# Altium footprint library lib_datalogger.PcbLib: 866 footprints (part 39 of 55)
Each footprint in its own frame and in the unit in brackets; x right, y up, seen from the top. Pads: shape width x height; smd on the part's side, far side on the other; paste and mask are expansions set on the pad; w line width, h text height; cw(c..) or ccw(c..) is an arc to the next point about the centre after c.
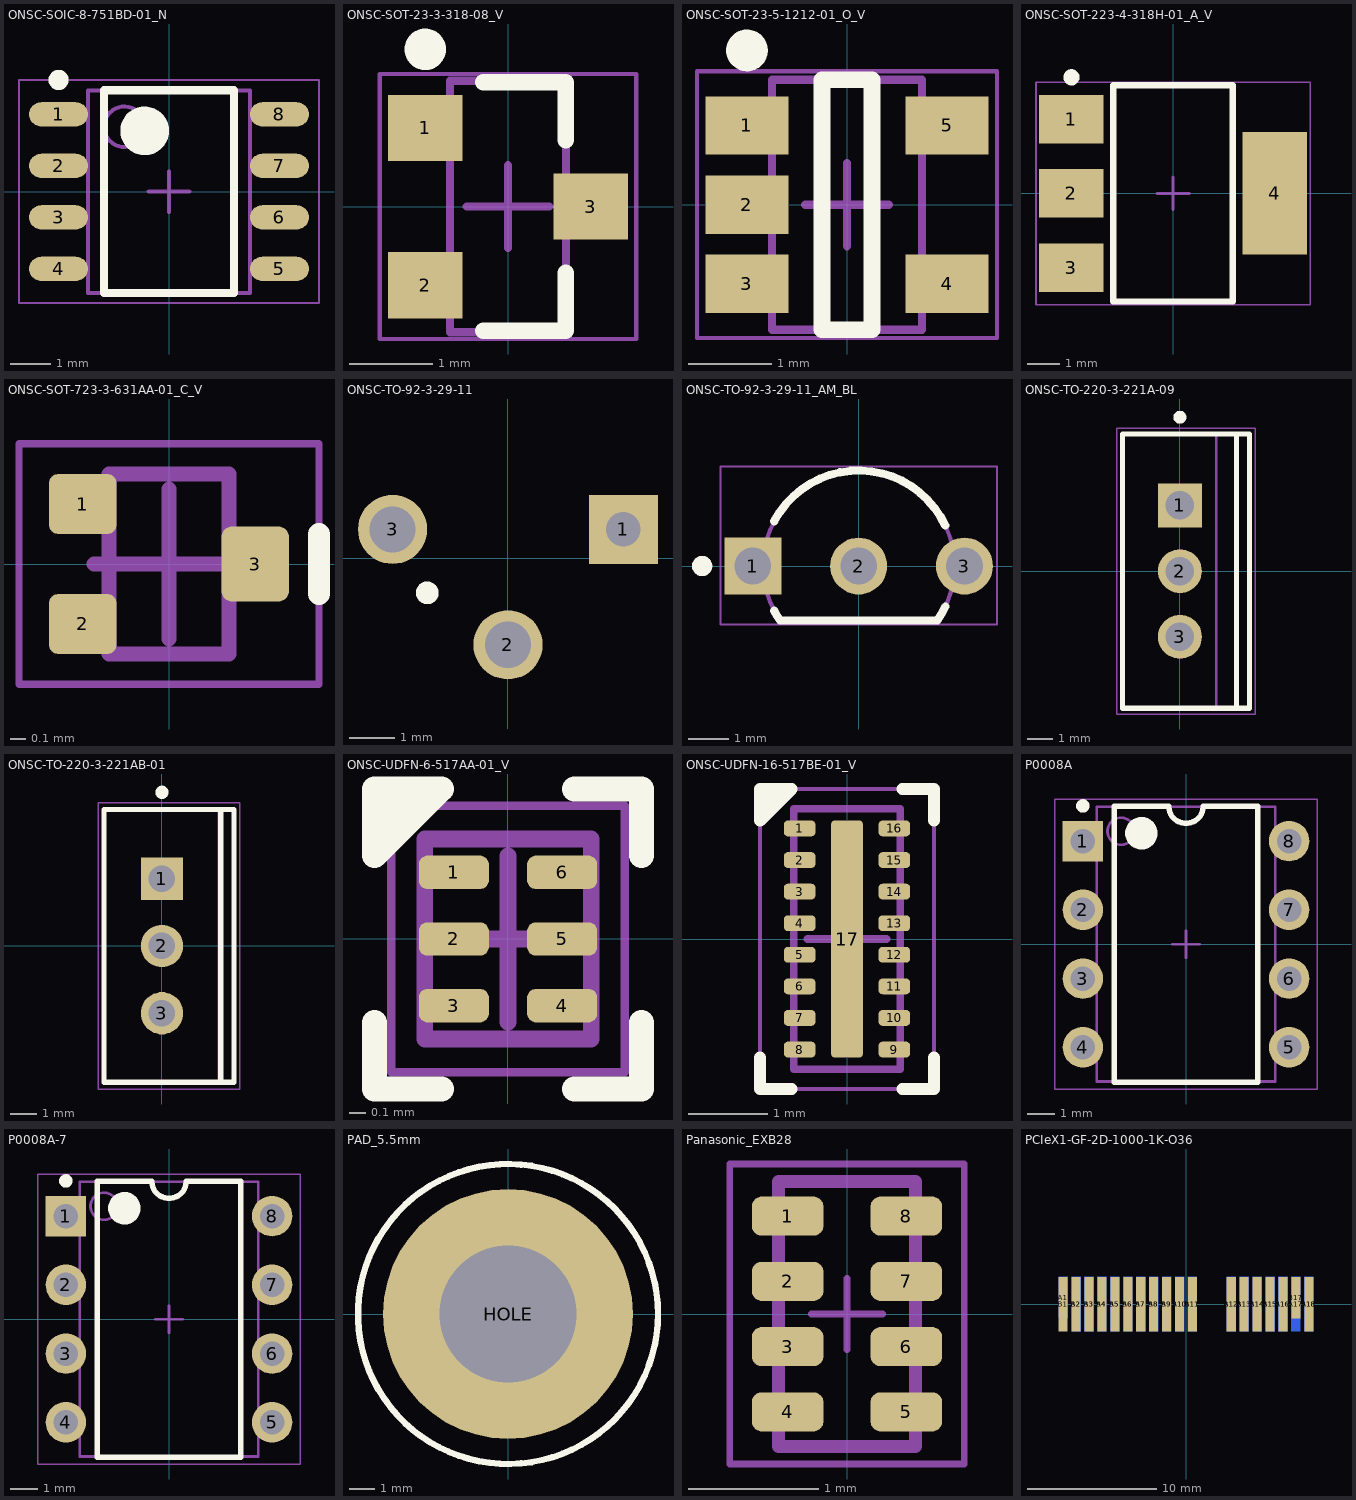
[diagram p38: the footprints below, top view; thin cyan lines are the x and y axes]

## ONSC-SOIC-8-751BD-01_N [mm] "SOIC, 8-Leads, Body 5x4mm, Pitch 1.27mm, IPC Medium Density"
height 1.75
pads (8):
  oval 1.45x0.6 smd: 1(-2.725,1.905) 2(-2.725,0.635) 3(-2.725,-0.635) 4(-2.725,-1.905) 5(2.725,-1.905) 6(2.725,-0.635) 7(2.725,0.635) 8(2.725,1.905)
Top Overlay:
  circle w0.25: c-2.725,2.755 r0.125
  circle w0.6: c-0.6,1.5 r0.3
  lines w0.2: -1.6,-2.5 -1.6,2.5 1.6,2.5 1.6,-2.5 -1.6,-2.5
Mechanical 13:
  circle w0.1: c-1.1,1.6 r0.5
  lines w0.1: -2,-2.5 -2,2.5 2,2.5 2,-2.5 -2,-2.5
Mechanical 15:
  lines w0.05: -3.7,-2.75 -3.7,2.75 3.7,2.75 3.7,-2.75 -3.7,-2.75
  lines w0.1: -0.5,0 0.5,0 ; 0,-0.5 0,0.5
3D body "SOIC127P600X175-8N.step": height 1.75, standoff 0, extent -3,-2.5 3,2.5

## ONSC-SOT-23-3-318-08_V [mm] "SOT23, 3-Leads, Body 3.04x1.4mm, Pitch 0.95mm"
height 1.11
pads (3):
  rect 0.9x0.8 smd: 1(-1,0.95) 2(-1,-0.95) 3(1,0)
Top Overlay:
  circle w0.25: c-1,1.9 r0.125
  lines w0.2: -0.3,-1.5 0.7,-1.5 0.7,-0.8 ; -0.3,1.5 0.7,1.5 0.7,0.8
Mechanical 13:
  lines w0.1: -0.7,-1.52 -0.7,1.52 0.7,1.52 0.7,-1.52 -0.7,-1.52
Mechanical 15:
  lines w0.05: -1.55,-1.6 -1.55,1.6 1.55,1.6 1.55,-1.6 -1.55,-1.6
  lines w0.1: -0.5,0 0.5,0 ; 0,-0.5 0,0.5
3D body "SOT95P237X111-3L.step": height 1.11, standoff 0, extent -1.42,-1.52 1.42,1.52

## ONSC-SOT-23-5-1212-01_O_V [mm] "SOT23, 5-Leads, Body 3x1.80mm, Pitch 0.95mm"
height 1.36
pads (5):
  rect 1x0.7 smd: 1(-1.2,0.95) 2(-1.2,0) 3(-1.2,-0.95) 4(1.2,-0.95) 5(1.2,0.95)
Top Overlay:
  circle w0.25: c-1.2,1.85 r0.125
  lines w0.2: -0.3,-1.5 0.3,-1.5 0.3,1.5 -0.3,1.5 -0.3,-1.5
Mechanical 13:
  lines w0.1: -0.9,-1.5 -0.9,1.5 0.9,1.5 0.9,-1.5 -0.9,-1.5
Mechanical 15:
  lines w0.05: -1.8,-1.6 -1.8,1.6 1.8,1.6 1.8,-1.6 -1.8,-1.6
  lines w0.1: -0.5,0 0.5,0 ; 0,-0.5 0,0.5
3D body "SOT95P280X136-5L.step": height 1.36, standoff 0, extent -1.55,-1.5 1.55,1.5

## ONSC-SOT-223-4-318H-01_A_V [mm] "SOT223, 4-Leads, Body 6.7x3.7mm, Pitch 2.3mm"
height 1.8
pads (4):
  rect 2x1.5 smd: 1(-3.15,2.3) 2(-3.15,0) 3(-3.15,-2.3)
  rect 2x3.8 smd: 4(3.15,0)
Top Overlay:
  circle w0.25: c-3.15,3.6 r0.125
  lines w0.2: -1.85,-3.35 -1.85,3.35 1.85,3.35 1.85,-3.35 -1.85,-3.35
Mechanical 13:
  lines w0.1: -1.85,-3.35 -1.85,3.35 1.85,3.35 1.85,-3.35 -1.85,-3.35
Mechanical 15:
  lines w0.05: -4.25,-3.45 -4.25,3.45 4.25,3.45 4.25,-3.45 -4.25,-3.45
  lines w0.1: -0.5,0 0.5,0 ; 0,-0.5 0,0.5
3D body "SOT230P700X180-4L.step": height 1.8, standoff 0, extent -3.65,-3.35 3.65,3.35

## ONSC-SOT-723-3-631AA-01_C_V [mm] "SOT23, 3-Leads, Body 1.25x0.85mm, Pitch 0.4mm"
height 0.55
pads (3):
  rrect30% 0.45x0.4 smd: 1(-0.575,0.4) 2(-0.575,-0.4)
  rrect30% 0.45x0.5 smd: 3(0.575,0)
Top Overlay:
  lines w0.15: 1,-0.2 1,0.2
Mechanical 13:
  lines w0.1: -0.4,-0.6 0.4,-0.6 0.4,0.6 -0.4,0.6 -0.4,-0.6
Mechanical 15:
  lines w0.05: -1,-0.8 1,-0.8 1,0.8 -1,0.8 -1,-0.8
  lines w0.1: -0.5,0 0.5,0 ; 0,-0.5 0,0.5
Top Designator:
  text ".Designator" at -1.27,-0.127 h0.6
3D body "SOT-723.STEP": height 0.45, standoff -0.01, extent -0.525,-0.625 0.525,0.625

## ONSC-TO-92-3-29-11 [mil] "TO, 3-Leads, Body Dia 4.7mm, Pitch 1.27mm"
height 309.84
pads (3):
  rect 60x60 hole 30: 1(100,25)
  round 60 hole 40: 2(0,-75) 3(-100,25)
Top Overlay:
  circle w9.84: c-70,-30 r4.92
Bottom Overlay:
  lines w10: -94,-6 -85,-50 -25,-50 ; -77.82,54.49 cw(c0,0) 77.82,54.49 ; 25,-50 85,-50 94,-6

## ONSC-TO-92-3-29-11_AM_BL [mm] "TO, 3-Leads, Body Dia 4.7mm, Pitch 2.6mm"
height 8.923
pads (3):
  rect 1.4x1.4 hole 0.9: 1(-2.6,0)
  round 1.4 hole 0.9: 2(0,0) 3(2.6,0)
Top Overlay:
  circle w0.25: c-3.85,0 r0.125
  lines w0.2: -2.077,-1.1 ccw(c0,0) -1.934,-1.335 1.934,-1.335 ccw(c0,0) 2.129,-0.994 ; -2.077,1.1 cw(c0,0) 2.129,0.994
Mechanical 13:
  lines w0.1: -1.934,-1.335 cw(c0,0) 1.934,-1.335 -1.934,-1.335
Mechanical 15:
  lines w0.05: -3.4,-1.435 -3.4,2.45 3.4,2.45 3.4,-1.435 -3.4,-1.435
  lines w0.1: -0.5,0 0.5,0 ; 0,-0.5 0,0.5
3D body "PCB3.step": height 4, standoff -8.7, extent -2.836,-0.222 2.836,0.223
3D body: height 5.33, standoff 1.5, extent -2.359,-1.335 2.359,2.351

## ONSC-TO-220-3-221A-09 [mm] "FM, 3-Leads, Body 10.55x4.85mm, Pitch 2.54mm"
height 19.85
pads (3):
  rect 1.7x1.7 hole 1.1: 1(0,2.54)
  round 1.7 hole 1.1: 2(0,0) 3(0,-2.54)
Top Overlay:
  circle w0.25: c0,5.95 r0.125
  lines w0.2: 2.185,-5.3 2.185,5.3 ; -2.215,-5.3 -2.215,5.3 2.685,5.3 2.685,-5.3 -2.215,-5.3
Mechanical 13:
  lines w0.1: 1.41,-5.275 1.41,5.275 ; -2.19,-5.275 2.66,-5.275 2.66,5.275 -2.19,5.275 -2.19,-5.275
Mechanical 15:
  lines w0.05: -2.44,-5.525 2.91,-5.525 2.91,5.525 -2.44,5.525 -2.44,-5.525
  lines w0.1: -0.5,0 0.5,0 ; 0,-0.5 0,0.5
3D body: height 19.85, standoff 18.98, extent 1.41,-5.05 2.66,5.05
3D body: height 17.43, standoff 17.05, extent 1.41,-5.05 2.66,-1.925
3D body: height 17.43, standoff 17.05, extent 1.41,1.925 2.66,5.05
3D body: height 17.05, standoff 16.67, extent 1.41,-5.05 2.66,-1.925
3D body: height 17.05, standoff 16.67, extent 1.41,1.925 2.66,5.05
3D body: height 17.79, standoff 17.43, extent 1.41,-5.05 2.66,-1.888
3D body: height 17.79, standoff 17.43, extent 1.41,1.888 2.66,5.05
3D body: height 16.68, standoff 16.31, extent 1.41,-5.05 2.66,-1.888
3D body: height 16.68, standoff 16.31, extent 1.41,1.888 2.66,5.05
3D body: height 18.12, standoff 17.79, extent 1.41,-5.05 2.66,-1.778
3D body: height 18.12, standoff 17.79, extent 1.41,1.778 2.66,5.05
3D body: height 16.32, standoff 15.98, extent 1.41,-5.05 2.66,-1.778
3D body: height 16.32, standoff 15.98, extent 1.41,1.778 2.66,5.05
3D body: height 18.42, standoff 18.12, extent 1.41,-5.05 2.66,-1.601
3D body: height 18.42, standoff 18.12, extent 1.41,1.601 2.66,5.05
3D body: height 15.99, standoff 15.69, extent 1.41,-5.05 2.66,-1.601
3D body: height 15.99, standoff 15.69, extent 1.41,1.601 2.66,5.05
3D body: height 18.66, standoff 18.41, extent 1.41,-5.05 2.66,-1.361
3D body: height 18.66, standoff 18.41, extent 1.41,1.361 2.66,5.05
3D body: height 15.69, standoff 15.45, extent 1.41,-5.05 2.66,-1.361
3D body: height 15.69, standoff 15.45, extent 1.41,1.361 2.66,5.05
3D body: height 18.83, standoff 18.65, extent 1.41,-5.05 2.66,-1.069
3D body: height 18.83, standoff 18.65, extent 1.41,1.069 2.66,5.05
3D body: height 15.45, standoff 15.27, extent 1.41,-5.05 2.66,-1.069
3D body: height 15.45, standoff 15.27, extent 1.41,1.069 2.66,5.05
3D body: height 18.94, standoff 18.83, extent 1.41,-5.05 2.66,-0.737
3D body: height 18.94, standoff 18.83, extent 1.41,0.737 2.66,5.05
3D body: height 15.28, standoff 15.16, extent 1.41,-5.05 2.66,-0.737
3D body: height 15.28, standoff 15.16, extent 1.41,0.737 2.66,5.05
3D body: height 18.98, standoff 18.94, extent 1.41,-5.05 2.66,-0.376
3D body: height 18.98, standoff 18.94, extent 1.41,0.376 2.66,5.05
3D body: height 15.17, standoff 15.13, extent 1.41,-5.05 2.66,-0.376
3D body: height 15.17, standoff 15.13, extent 1.41,0.376 2.66,5.05
3D body: height 15.13, standoff 13.65, extent 1.41,-5.05 2.66,5.05
3D body: height 13.65, standoff 2.8, extent -2.19,-5.275 2.66,5.275
3D body: height 0, standoff -1.6, extent -0.245,-2.94 0.245,-2.14
3D body: height 2.8, standoff 0, extent -0.245,-3.21 0.245,-1.87
3D body: height 0, standoff -1.6, extent -0.245,-0.4 0.245,0.4
3D body: height 2.8, standoff 0, extent -0.245,-0.67 0.245,0.67
3D body: height 0, standoff -1.6, extent -0.245,2.14 0.245,2.94
3D body: height 2.8, standoff 0, extent -0.245,1.87 0.245,3.21

## ONSC-TO-220-3-221AB-01 [mm] "FM, 3-Leads, Body 10.3x4.85mm, Pitch 2.54mm"
height 19.68
pads (3):
  rect 1.6x1.6 hole 1: 1(0,2.54)
  round 1.6 hole 1: 2(0,0) 3(0,-2.54)
Top Overlay:
  circle w0.25: c0,5.8 r0.125
  lines w0.2: 2.215,-5.15 2.215,5.15 ; -2.185,-5.15 -2.185,5.15 2.715,5.15 2.715,-5.15 -2.185,-5.15
Mechanical 13:
  lines w0.1: 2.14,-5.15 2.14,5.15 ; -2.16,-5.15 2.69,-5.15 2.69,5.15 -2.16,5.15 -2.16,-5.15
Mechanical 15:
  lines w0.05: -2.41,-5.4 2.94,-5.4 2.94,5.4 -2.41,5.4 -2.41,-5.4
  lines w0.1: -0.5,0 0.5,0 ; 0,-0.5 0,0.5
3D body: height 19.68, standoff 18.71, extent 2.14,-4.975 2.69,4.975
3D body: height 17.24, standoff 16.88, extent 2.14,-4.975 2.69,-1.825
3D body: height 17.24, standoff 16.88, extent 2.14,1.825 2.69,4.975
3D body: height 16.88, standoff 16.52, extent 2.14,-4.975 2.69,-1.825
3D body: height 16.88, standoff 16.52, extent 2.14,1.825 2.69,4.975
3D body: height 17.58, standoff 17.24, extent 2.14,-4.975 2.69,-1.79
3D body: height 17.58, standoff 17.24, extent 2.14,1.79 2.69,4.975
3D body: height 16.53, standoff 16.18, extent 2.14,-4.975 2.69,-1.79
3D body: height 16.53, standoff 16.18, extent 2.14,1.79 2.69,4.975
3D body: height 17.9, standoff 17.58, extent 2.14,-4.975 2.69,-1.686
3D body: height 17.9, standoff 17.58, extent 2.14,1.686 2.69,4.975
3D body: height 16.19, standoff 15.87, extent 2.14,-4.975 2.69,-1.686
3D body: height 16.19, standoff 15.87, extent 2.14,1.686 2.69,4.975
3D body: height 18.18, standoff 17.89, extent 2.14,-4.975 2.69,-1.517
3D body: height 18.18, standoff 17.89, extent 2.14,1.517 2.69,4.975
3D body: height 15.87, standoff 15.59, extent 2.14,-4.975 2.69,-1.517
3D body: height 15.87, standoff 15.59, extent 2.14,1.517 2.69,4.975
3D body: height 18.4, standoff 18.17, extent 2.14,-4.975 2.69,-1.29
3D body: height 18.4, standoff 18.17, extent 2.14,1.29 2.69,4.975
3D body: height 15.59, standoff 15.36, extent 2.14,-4.975 2.69,-1.29
3D body: height 15.59, standoff 15.36, extent 2.14,1.29 2.69,4.975
3D body: height 18.57, standoff 18.4, extent 2.14,-4.975 2.69,-1.014
3D body: height 18.57, standoff 18.4, extent 2.14,1.014 2.69,4.975
3D body: height 15.37, standoff 15.19, extent 2.14,-4.975 2.69,-1.014
3D body: height 15.37, standoff 15.19, extent 2.14,1.014 2.69,4.975
3D body: height 18.67, standoff 18.57, extent 2.14,-4.975 2.69,-0.698
3D body: height 18.67, standoff 18.57, extent 2.14,0.698 2.69,4.975
3D body: height 15.2, standoff 15.09, extent 2.14,-4.975 2.69,-0.698
3D body: height 15.2, standoff 15.09, extent 2.14,0.698 2.69,4.975
3D body: height 18.71, standoff 18.67, extent 2.14,-4.975 2.69,-0.356
3D body: height 18.71, standoff 18.67, extent 2.14,0.356 2.69,4.975
3D body: height 15.1, standoff 15.06, extent 2.14,-4.975 2.69,-0.356
3D body: height 15.1, standoff 15.06, extent 2.14,0.356 2.69,4.975
3D body: height 15.06, standoff 13.48, extent 2.14,-4.975 2.69,4.975
3D body: height 13.48, standoff 2.8, extent -2.16,-5.15 2.69,5.15
3D body: height 0, standoff -1.6, extent -0.275,-2.92 0.275,-2.16
3D body: height 2.8, standoff 0, extent -0.275,-3.21 0.275,-1.87
3D body: height 0, standoff -1.6, extent -0.275,-0.38 0.275,0.38
3D body: height 2.8, standoff 0, extent -0.275,-0.67 0.275,0.67
3D body: height 0, standoff -1.6, extent -0.275,2.16 0.275,2.92
3D body: height 2.8, standoff 0, extent -0.275,1.87 0.275,3.21

## ONSC-UDFN-6-517AA-01_V [mm] "SON, 6-Leads, Body 1.2x1mm, Pitch 0.4mm"
height 0.55
pads (6):
  rrect50% 0.42x0.2 smd: 1(-0.325,0.4) 2(-0.325,0) 3(-0.325,-0.4) 4(0.325,-0.4) 5(0.325,0) 6(0.325,0.4)
Top Overlay:
  region: -0.8,0.9 -0.8,0.5 -0.4,0.9
  lines w0.15: -0.8,-0.5 -0.8,-0.9 -0.4,-0.9 ; 0.4,-0.9 0.8,-0.9 0.8,-0.5 ; 0.4,0.9 0.8,0.9 0.8,0.5 ; -0.8,0.5 -0.4,0.9 -0.8,0.9 -0.8,0.5
Mechanical 13:
  lines w0.1: -0.5,-0.6 0.5,-0.6 0.5,0.6 -0.5,0.6 -0.5,-0.6
Mechanical 15:
  lines w0.05: -0.7,-0.8 0.7,-0.8 0.7,0.8 -0.7,0.8 -0.7,-0.8
  lines w0.1: -0.5,0 0.5,0 ; 0,-0.5 0,0.5
Top Designator:
  text ".Designator" at -0.762,-1.143 h0.6
3D body: height 0.55, standoff 0, extent -0.5,-0.6 0.5,0.6

## ONSC-UDFN-16-517BE-01_V [mm] "SON, 16-Leads, Body 3.3x1.35mm, Pitch 0.4mm, Thermal Pad 3x0.5mm"
height 0.55
pads (17):
  rrect50% 0.4x0.2 smd: 1(-0.6,1.4) 2(-0.6,1) 3(-0.6,0.6) 4(-0.6,0.2) 5(-0.6,-0.2) 6(-0.6,-0.6) 7(-0.6,-1) 8(-0.6,-1.4) 9(0.6,-1.4) 10(0.6,-1) 11(0.6,-0.6) 12(0.6,-0.2) 13(0.6,0.2) 14(0.6,0.6) 15(0.6,1) 16(0.6,1.4)
  rrect20% 0.4x3 smd: 17(0,0)
Top Overlay:
  region: -1.1,1.9 -1.1,1.5 -0.7,1.9
  lines w0.15: -1.1,-1.5 -1.1,-1.9 -0.7,-1.9 ; 0.7,-1.9 1.1,-1.9 1.1,-1.5 ; 0.7,1.9 1.1,1.9 1.1,1.5 ; -1.1,1.5 -1.1,1.9 -0.7,1.9 -1.1,1.5
Mechanical 13:
  lines w0.1: -0.675,-1.65 0.675,-1.65 0.675,1.65 -0.675,1.65 -0.675,-1.65
Mechanical 15:
  lines w0.05: -1.1,-1.9 1.1,-1.9 1.1,1.9 -1.1,1.9 -1.1,-1.9
  lines w0.1: -0.5,0 0.5,0 ; 0,-0.5 0,0.5
Top Designator:
  text ".Designator" at -1.016,-1.27 h0.6
3D body: height 0.55, standoff 0, extent -0.675,-1.65 0.675,1.65

## P0008A [mm] "DIP, 8-Leads, Body 10.15x6.6mm, Pitch 2.54mm"
height 5.08
pads (8):
  rect 1.5x1.5 hole 0.9: 1(-3.81,3.81)
  round 1.5 hole 0.9: 2(-3.81,1.27) 3(-3.81,-1.27) 4(-3.81,-3.81) 5(3.81,-3.81) 6(3.81,-1.27) 7(3.81,1.27) 8(3.81,3.81)
Top Overlay:
  circle w0.6: c-1.65,4.1 r0.3
  circle w0.25: c-3.81,5.11 r0.125
  lines w0.2: -2.65,-5.1 2.65,-5.1 2.65,5.1 0.635,5.1 cw(c0,5.1) -0.635,5.1 -2.65,5.1 -2.65,-5.1
Mechanical 1:
  text ".Designator" at -1.524,-0.508 h1.02
Mechanical 13:
  circle w0.1: c-2.4,4.175 r0.5
  lines w0.1: -3.3,-5.075 3.3,-5.075 3.3,5.075 -3.3,5.075 -3.3,-5.075
Mechanical 15:
  lines w0.05: -4.85,-5.35 4.85,-5.35 4.85,5.35 -4.85,5.35 -4.85,-5.35
  lines w0.1: -0.5,0 0.5,0 ; 0,-0.5 0,0.5
3D body: height 5.08, standoff 0.51, extent -3.3,-5.075 3.3,5.075
3D body: height 0, standoff -1.6, extent 3.675,3.45 3.945,4.17
3D body: height 2.93, standoff 2.66, extent 3.3,3.31 3.945,4.31
3D body: height 2.66, standoff 0, extent 3.675,3.31 3.945,4.31
3D body: height 0, standoff -1.6, extent 3.675,0.91 3.945,1.63
3D body: height 2.93, standoff 2.66, extent 3.3,0.77 3.945,1.77
3D body: height 2.66, standoff 0, extent 3.675,0.77 3.945,1.77
3D body: height 0, standoff -1.6, extent 3.675,-1.63 3.945,-0.91
3D body: height 2.93, standoff 2.66, extent 3.3,-1.77 3.945,-0.77
3D body: height 2.66, standoff 0, extent 3.675,-1.77 3.945,-0.77
3D body: height 0, standoff -1.6, extent 3.675,-4.17 3.945,-3.45
3D body: height 2.93, standoff 2.66, extent 3.3,-4.31 3.945,-3.31
3D body: height 2.66, standoff 0, extent 3.675,-4.31 3.945,-3.31
3D body: height 0, standoff -1.6, extent -3.945,-4.17 -3.675,-3.45
3D body: height 2.93, standoff 2.66, extent -3.945,-4.31 -3.3,-3.31
3D body: height 2.66, standoff 0, extent -3.945,-4.31 -3.675,-3.31
3D body: height 0, standoff -1.6, extent -3.945,-1.63 -3.675,-0.91
3D body: height 2.93, standoff 2.66, extent -3.945,-1.77 -3.3,-0.77
3D body: height 2.66, standoff 0, extent -3.945,-1.77 -3.675,-0.77
3D body: height 0, standoff -1.6, extent -3.945,0.91 -3.675,1.63
3D body: height 2.93, standoff 2.66, extent -3.945,0.77 -3.3,1.77
3D body: height 2.66, standoff 0, extent -3.945,0.77 -3.675,1.77
3D body: height 0, standoff -1.6, extent -3.945,3.45 -3.675,4.17
3D body: height 2.93, standoff 2.66, extent -3.945,3.31 -3.3,4.31
3D body: height 2.66, standoff 0, extent -3.945,3.31 -3.675,4.31

## P0008A-7 [mm] "DIP, 8-Leads, Body 10.15x6.6mm, Pitch 2.54mm"
height 5.08
pads (8):
  rect 1.5x1.5 hole 0.9: 1(-3.81,3.81)
  round 1.5 hole 0.9: 2(-3.81,1.27) 3(-3.81,-1.27) 4(-3.81,-3.81) 5(3.81,-3.81) 6(3.81,-1.27) 7(3.81,1.27) 8(3.81,3.81)
Top Overlay:
  circle w0.25: c-3.81,5.11 r0.125
  circle w0.6: c-1.65,4.1 r0.3
  lines w0.2: -2.65,-5.1 -2.65,5.1 -0.635,5.1 ccw(c0,5.1) 0.635,5.1 2.65,5.1 2.65,-5.1 -2.65,-5.1
Mechanical 13:
  circle w0.1: c-2.4,4.175 r0.5
  lines w0.1: -3.3,-5.075 -3.3,5.075 3.3,5.075 3.3,-5.075 -3.3,-5.075
Mechanical 15:
  lines w0.05: -4.85,-5.35 -4.85,5.35 4.85,5.35 4.85,-5.35 -4.85,-5.35
  lines w0.1: -0.5,0 0.5,0 ; 0,-0.5 0,0.5
3D body "1437537-5.stp": height 5, standoff -3.76, extent -5.156,-5.156 4.902,4.902
3D body "User Library-DIP-8-ru-5mm.STEP": height 10, standoff 1.5, extent -4.067,-5.047 3.683,4.953

## PAD_5.5mm [mm]
pads (1):
  round 10 hole 5.5: HOLE(0,0)
Top Overlay:
  circle w0.254: c0,0 r6

## Panasonic_EXB28 [mm] "Resistor network, 0402x4, convex terminal"
height 0.45
pads (8):
  rrect50% 0.55x0.3 smd: 1(-0.455,0.75) 2(-0.455,0.25) 3(-0.455,-0.25) 4(-0.455,-0.75) 5(0.455,-0.75) 6(0.455,-0.25) 7(0.455,0.25) 8(0.455,0.75)
Mechanical 13:
  lines w0.1: -0.525,-1.016 0.525,-1.016 0.525,1.016 -0.525,1.016 -0.525,-1.016
Mechanical 15:
  lines w0.05: -0.275,0 0.275,0 ; 0,-0.275 0,0.275 ; -0.9,-1.15 0.9,-1.15 0.9,1.15 -0.9,1.15 -0.9,-1.15
Top Designator:
  text ".Designator" at -0.889,-1.27 h0.6
3D body "741C083.STEP": height 0.37, standoff -0.01, extent -0.502,-1 0.502,1

## PCIeX1-GF-2D-1000-1K-O36 [mm] "Golden finger, PCIeX1, Dual, Opposite, Pitch 1mm, 36-Position"
pads (36):
  rect 0.7x3.2 smd far side paste-1: A1(-9.5,0.5)
  rect 0.7x4.2 smd far side paste-1: A2(-8.5,0) A3(-7.5,0) A4(-6.5,0) A5(-5.5,0) A6(-4.5,0) A7(-3.5,0) A8(-2.5,0) A9(-1.5,0) A10(-0.5,0) A11(0.5,0) A12(3.5,0) A13(4.5,0) A14(5.5,0) A15(6.5,0) A16(7.5,0) A17(8.5,0) A18(9.5,0)
  rect 0.7x4.2 smd paste-1: B1(-9.5,0) B2(-8.5,0) B3(-7.5,0) B4(-6.5,0) B5(-5.5,0) B6(-4.5,0) B7(-3.5,0) B8(-2.5,0) B9(-1.5,0) B10(-0.5,0) B11(0.5,0) B12(3.5,0) B13(4.5,0) B14(5.5,0) B15(6.5,0) B16(7.5,0) B18(9.5,0)
  rect 0.7x3.2 smd paste-1: B17(8.5,0.5)
Top Solder:
  rectangle: -10.4,-3.75 10.4,2.225
Bottom Solder:
  rectangle: -10.4,-3.75 10.4,2.225